# Altium footprint library rescap.PcbLib: 85 footprints (part 6 of 6)
Each footprint in its own frame and in the unit in brackets; x right, y up, seen from the top. Pads: shape width x height; smd on the part's side, far side on the other; paste and mask are expansions set on the pad; w line width, h text height; cw(c..) or ccw(c..) is an arc to the next point about the centre after c.
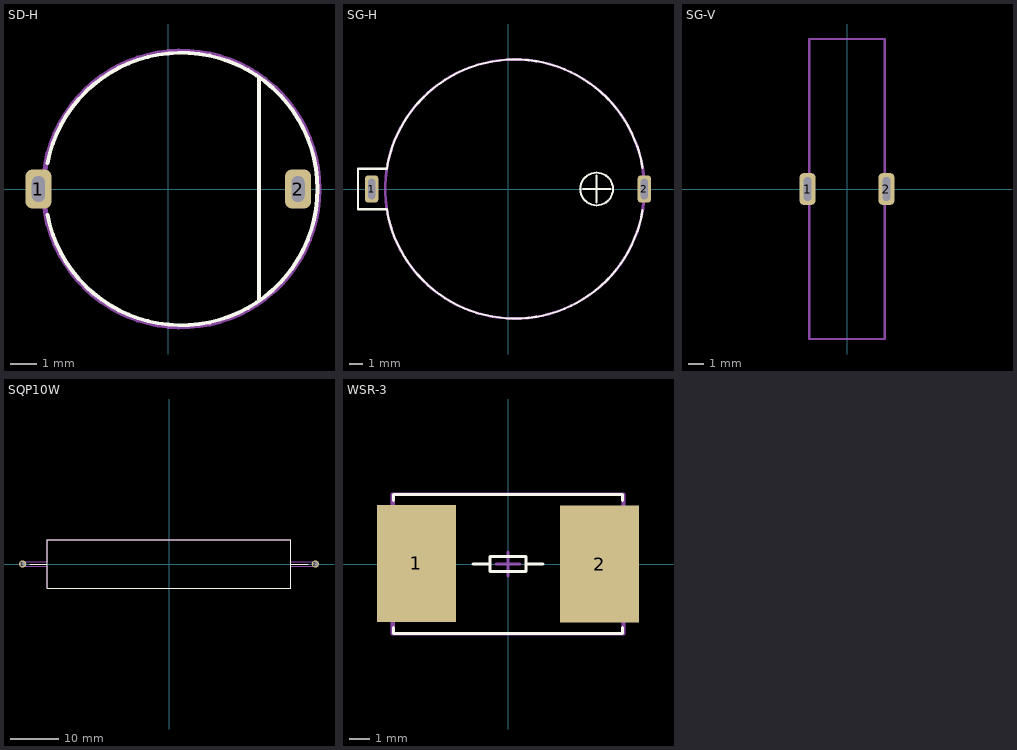
[diagram p5: the footprints below, top view; thin cyan lines are the x and y axes]

## SD-H [mm]
height 6
pads (2):
  rrect50% 1x1.5 hole 0.5 slot 1 at 90 deg: 1(-5,0) 2(5,0)
Top Overlay:
  lines w0.15: -4.656,-0.991 ccw(c0.5,0) 5.75,0 ccw(c0.5,0) -4.656,0.991 ; 3.5,-4.3 3.5,4.3
Top Courtyard:
  circle w0.2: c0.5,0 r5.308
3D body: height 5.4, standoff 0.6, extent -4.75,-5.247 5.75,5.247
3D body: height 5.5, standoff 0.5, extent -3.5,-3.997 4.5,3.997

## SG-H [mm]
height 6
pads (2):
  rrect50% 1x2 hole 0.5 slot 1.5 at 90 deg: 1(-10,0) 2(10,0)
Top Overlay:
  circle w0.15: c6.5,0 r1.2
  lines w0.15: -8.895,1.483 -11,1.483 -11,-1.483 -8.884,-1.483 ; -8.884,-1.482 ccw(c0.5,0) 9.874,-1.543 ; -8.884,1.482 cw(c0.5,0) 9.874,1.543 ; 5.5,0 7.5,0 ; 6.5,-1 6.5,1
Top Courtyard:
  circle w0.2: c0.5,0 r9.505
3D body: height 5.5, standoff 0.5, extent -7.5,-8 8.5,8
3D body: height 5.7, standoff 5.5, extent -10.1,-1.3 0,1.3
3D body: height 0.5, standoff -3, extent 9.9,-0.5 10.1,0.5
3D body: height 5.7, standoff -3, extent -10.1,-0.5 -9.9,0.5
3D body: height 0.5, standoff 0.3, extent 0,-1.3 10.1,1.3
3D body: height 5.7, standoff 2, extent -10.1,-1.3 -9.9,1.3
3D body: height 5.4, standoff 0.6, extent -9,-9.497 10,9.497

## SG-V [mm]
height 6
pads (2):
  rrect50% 1x2 hole 0.5 slot 1.5 at 90 deg: 1(-2.5,0) 2(2.5,0)
Top Courtyard:
  lines w0.15: -2.4,-9.5 -2.4,9.5 2.4,9.5 2.4,-9.5 -2.4,-9.5
3D body: height 18, standoff 2, extent -2.5,-8 2.5,8
3D body: height 1, standoff -3, extent -2.6,-0.5 -2.4,0.5
3D body: height 8, standoff 0.5, extent -2.8,-1.3 -2.6,1.3
3D body: height 8, standoff 0.5, extent 2.6,-1.3 2.8,1.3
3D body: height 1, standoff -3, extent 2.4,-0.5 2.6,0.5
3D body: height 19.5, standoff 0.5, extent -2.4,-9.497 2.4,9.497

## SQP10W [mm]
height 10
pads (2):
  round 1.5 hole 1: 1(-30,0) 2(30,0)
Top Overlay:
  lines w0.15: -28.5,0 -25,0 ; 25,0 28.5,0 ; -25,-5 -25,5 25,5 25,-5 -25,-5
Top Courtyard:
  lines w0.15: -30,-0.5 -30,0.5 -25,0.5 -25,5 0,5 25,5 25,0.5 30,0.5 30,-0.5 25,-0.5 25,-5 0,-5 -25,-5 -25,-0.5 -30,-0.5
3D body "[res] SQP 10W.stp": height 10, standoff -4, extent -30.349,-5 30.349,5

## WSR-3 [mm]
height 2.4
pads (2):
  rect 3.94x5.84 smd: 1(-4.575,0.025) 2(4.575,0)
Top Overlay:
  lines w0.15: -5.73,-3.175 -5.73,-3.475 5.725,-3.475 5.725,-3.175 ; -5.73,3.175 -5.73,3.475 5.725,3.475 5.725,3.175 ; -1.75,0 -0.9,0 ; 1.75,0 0.9,0 ; -0.9,0 -0.9,-0.375 0,-0.375 0.9,-0.375 0.9,0 ; -0.9,0 -0.9,0.375 0,0.375 0.9,0.375 0.9,0
Top Courtyard:
  lines w0.15: -0.6,0 0,0 ; 0,-0.6 0,0 ; 0,0.6 0,0 ; 0.6,0 0,0 ; -5.8,-3.5 5.8,-3.5 5.8,3.5 -5.8,3.5 -5.8,-3.5
Mechanical 29:
  lines w0.15: -5.725,-3.475 5.75,-3.475 5.75,3.475 -5.725,3.475 -5.725,-3.475
  text ".Designator" at -2.9,-0.2 h1
3D body "WSR-3.STEP": height 2.43, standoff 0, extent -5.785,-3.465 5.775,3.515